# Altium footprint library Hydra_Ref_pcb.PcbLib: 353 footprints (part 21 of 23)
Each footprint in its own frame and in the unit in brackets; x right, y up, seen from the top. Pads: shape width x height; smd on the part's side, far side on the other; paste and mask are expansions set on the pad; w line width, h text height; cw(c..) or ccw(c..) is an arc to the next point about the centre after c.
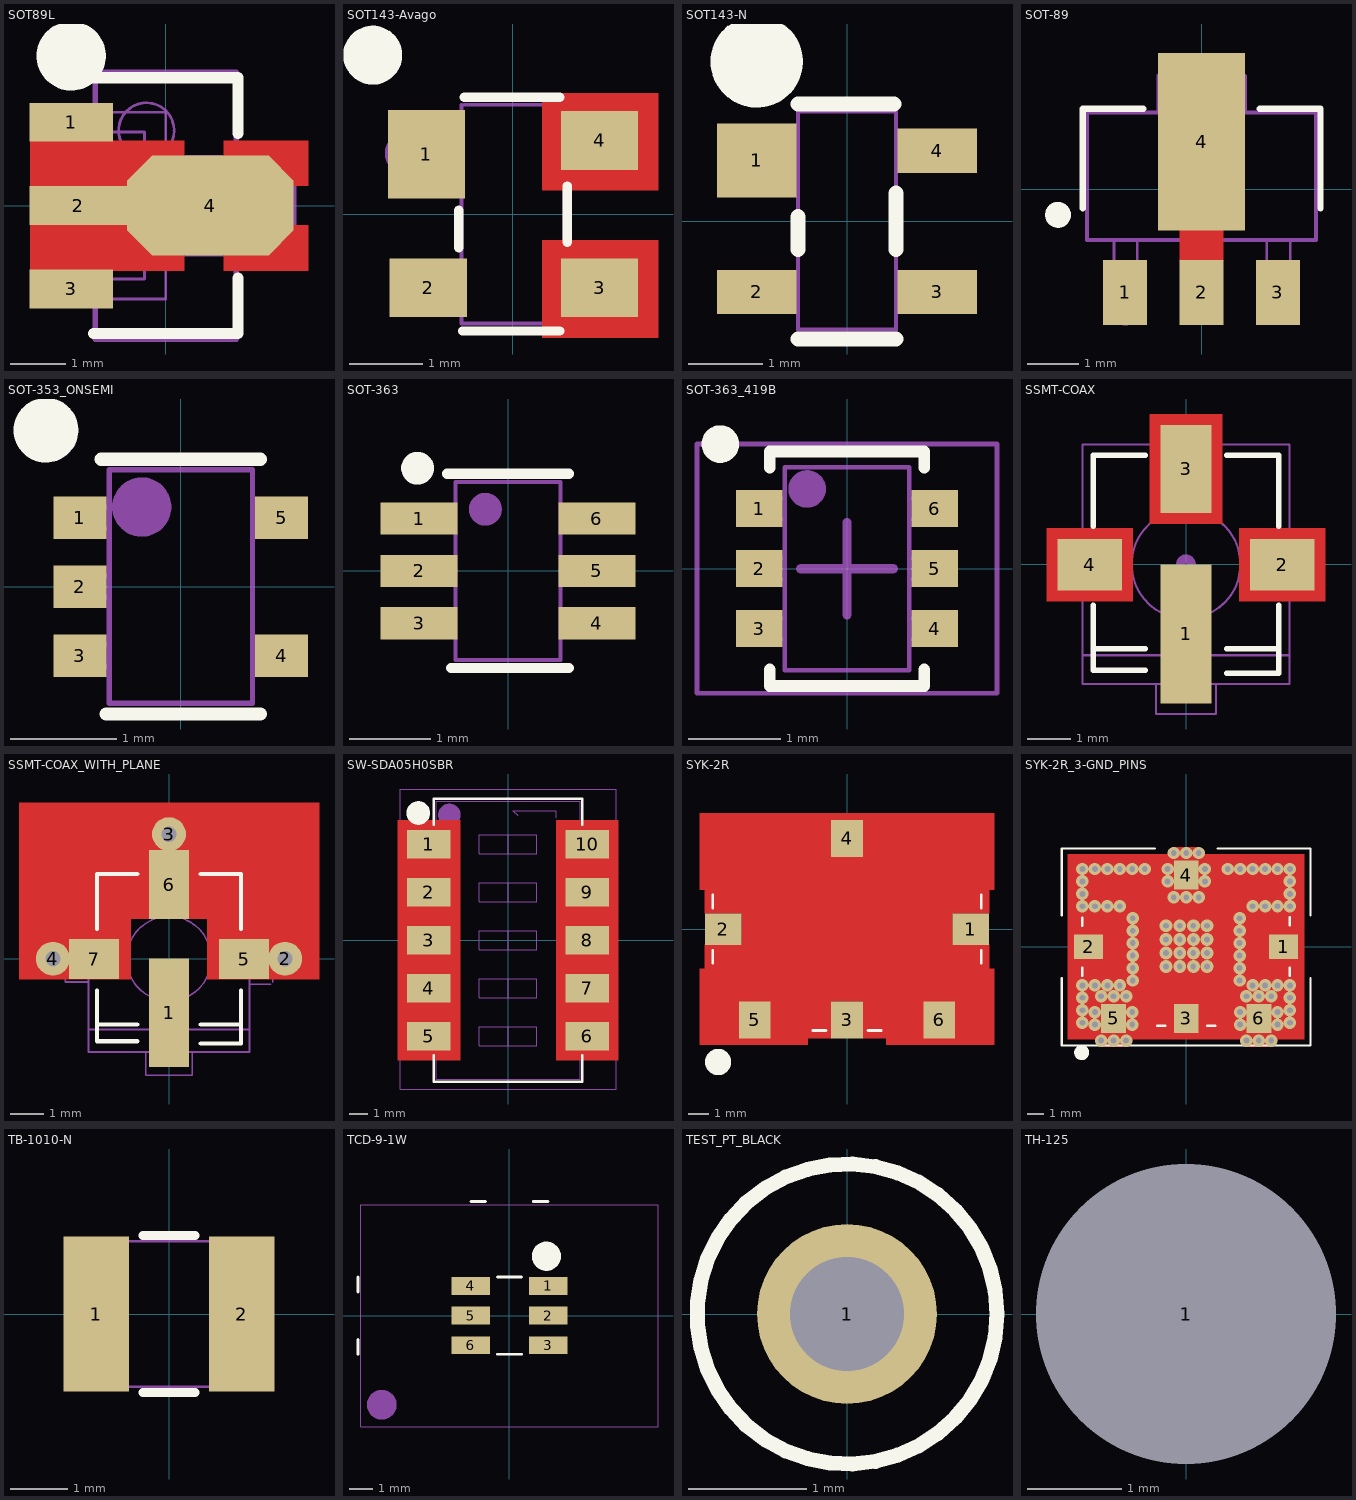
[diagram p20: the footprints below, top view; thin cyan lines are the x and y axes]

## SOT89L [mil] "SOT89, 3-Leads, Body 4.5x2.4 mm, Pitch 1.5mm, Lead Span 4.1mm, IPC High Density"
height 63
pads (4):
  rect 59x27.5 smd: 1(-66.93,59.06) 3(-66.93,-59.06)
  rect 69x27.5 smd: 2(-62,0)
  oct 118.11x70.87 smd: 4(31.5,0)
Top Layer:
  pour cut-out: 13,-46 -96,-46 -96,-14 -90,-14 -90,14 -96,14 -96,46 13,46
  pour cut-out: 76,-46 41,-46 41,46 76,46
  pour cut-out: 101,46 101,14 76,14 76,46
  pour cut-out: 101,-46 101,-14 76,-14 76,-46
Top Overlay:
  circle w25: c-67,106 r12
  lines w7.87: -51.18,-90.55 51.18,-90.55 51.18,-51.18 ; -51.18,90.55 51.18,90.55 51.18,51.18
9 Top Assy:
  lines w3: -50,-66.06 -70,-66.06 -70,-52.06 -50,-52.06 ; -50,-7 -70,-7 -70,7 -50,7 ; -50,52.06 -70,52.06 -70,66.06 -50,66.06
  lines w3.94: -50,-94.49 -50,94.49 50,94.49 50,-94.49 -50,-94.49
  lines w5: 50,-35 75,-35 90,-20 90,20 75,35 50,35
  text ".Designator" at -37.37,-11.55 h29
13 Top 3D Bodies:
  circle w2: c-13.78,53.15 r19.68
  lines w2: -49.21,-90.55 -49.21,88.58 49.21,88.58 49.21,-90.55 -49.21,-90.55
Mechanical 30:
  lines w2: -70,-66.06 0,-66.06 0,-35 75,-35 90,-20 90,20 75,35 0,35 0,66.06 -70,66.06 -70,52.06 -15,52.06 -15,7 -70,7 -70,-7 -15,-7 -15,-52.06 -70,-52.06 -70,-66.06
3D body: height 14.96, standoff 0, extent -70.02,-66.08 90.02,66.08
3D body: height 63, standoff 0, extent -49.19,-90.53 49.19,88.56

## SOT143-Avago [mm] "1.9mm PITCH 1.3mmW 2.3mmL 1.1mmH -4pins"
height 1.2
pads (4):
  rect 1.05x1.2 smd: 1(-1.175,0.813)
  rect 1.05x0.8 smd: 2(-1.15,-1) 3(1.175,-1) 4(1.175,1)
Top Layer:
  pour cut-out: 0.395,1.644 1.969,1.644 1.969,0.324 0.395,0.324
  pour cut-out: 0.395,-0.356 1.969,-0.356 1.969,-1.676 0.395,-1.676
Top Overlay:
  circle w0.4: c-1.905,2.159 r0.2
  lines w0.127: -0.737,-0.457 -0.737,0.051 ; -0.686,-1.587 0.635,-1.587 ; -0.66,1.588 0.635,1.588 ; 0.737,-0.381 0.737,0.381
9 Top Assy:
  circle w0.305: c-1.46,0.826 r0.127
  lines w0.051: -0.7,-1.27 -1.325,-1.27 -1.325,-0.73 -0.7,-0.73 ; -0.7,0.381 -1.365,0.381 -1.365,1.281 -0.7,1.281 ; -0.7,1.486 -0.7,-1.486 0.7,-1.486 0.7,1.486 ; -0.66,1.486 0.66,1.486 ; 0.7,-1.27 1.325,-1.27 1.325,-0.73 0.7,-0.73 ; 0.7,0.73 1.325,0.73 1.325,1.27 0.7,1.27
  text ".Designator" at -0.24,1.156 h0.71
3D body: height 1.2, standoff 0, extent -1.9,-1.75 1.9,1.75

## SOT143-N [mm] "1.9mm PITCH 1.3mmW 2.3mmL 1.1mmH -4pins"
height 1.194
pads (4):
  rect 1.07x1 smd: 1(-1.22,0.825)
  rect 1.07x0.6 smd: 2(-1.22,-0.953) 3(1.22,-0.953) 4(1.22,0.952)
Top Overlay:
  circle w0.635: c-1.219,2.159 r0.305
  lines w0.203: -0.66,-1.587 0.66,-1.587 ; -0.66,-0.381 -0.66,0.064 ; -0.66,1.587 0.635,1.587 ; 0.66,-0.381 0.66,0.381
9 Top Assy:
  circle w0.305: c-1.46,0.826 r0.127
  lines w0.051: -0.66,-1.118 -1.143,-1.118 -1.143,-0.813 -0.66,-0.813 ; -0.66,0.381 -1.143,0.381 -1.143,1.27 -0.66,1.27 ; 0.66,-1.092 1.143,-1.092 1.143,-0.788 0.66,-0.788 ; 0.66,0.813 1.143,0.813 1.143,1.117 0.66,1.117 ; -0.66,-1.461 0.66,-1.461 0.66,1.486 -0.66,1.486 -0.66,-1.461
  text ".Designator" at 0.35,-1.25 h0.71
3D body: height 1.19, standoff 0, extent -1.95,-1.75 1.95,1.905

## SOT-89 [mil] "Pins 2 and 4 connected to GND"
height 63
pads (5):
  rect 34x50 smd: 1(-59.06,-80) 2(0,-80) 3(59.06,-80)
  round 0 smd paste-1000 mask-1000: 2(0,77.5)
  rect 66.93x137.01 smd: 4(0,36.5)
Top Layer:
  rectangle: -17,-55.51 17,-31.5
Top Overlay:
  circle w10: c-111,-20 r5
  lines w5: -92,-15 -92,62 -45,62 ; 45,62 92,62 92,-15
Top Paste:
  region: -33.7,-32 -17,-32 -17,-104.8 16.9,-104.8 16.9,-32.1 33.3,-32.1 33.3,104.9 -33.7,104.9
Top Solder:
  pour cut-out: -87,-116 -87,-50 -45,116 45,116 87,-50 87,-116
  region: -37,-36 -21,-36 -21,-109 21,-109 21,-36 37,-36 37,109 -37,109
Bottom Solder:
  rectangle: -51,-116 50,112
9 Top Assy:
  circle w12: c-59.3,-94.5 r5
  lines w2: -34,59.06 -34,87.8 34,87.8 34,59.06
  lines w2.01: -67.72,-39.37 -67.72,-78.74 -49.61,-78.74 -49.61,-39.37 ; -9.45,-39.37 -9.45,-78.74 8.66,-78.74 8.66,-39.37 ; 50.39,-39.37 50.39,-78.74 68.5,-78.74 68.5,-39.37
  lines w3: -88.58,-39.37 -88.58,59.06 88.58,59.06 88.58,-39.37 -88.58,-39.37
  text ".Designator" at -49,4 h20
3D body: height 63, standoff 0, extent -88.56,-39.35 88.56,59.04

## SOT-353_ONSEMI [mm] "CASE 419A-02, ISSUE J"
height 1.1
pads (5):
  rect 0.5x0.4 smd: 1(-0.95,0.65) 2(-0.95,0) 3(-0.95,-0.65) 4(0.95,-0.65) 5(0.95,0.65)
Top Overlay:
  circle w0.305: c-1.27,1.473 r0.152
  lines w0.127: -0.75,1.2 0.75,1.2 ; -0.702,-1.2 0.75,-1.2
9 Top Assy:
  circle w0.305: c-0.368,0.749 r0.127
  lines w0.051: -0.828,-0.749 -0.828,-0.545 ; -0.828,-0.101 -0.828,0.102 ; -0.828,0.547 -0.828,0.75 ; -0.675,-0.749 -1.05,-0.749 -1.05,-0.545 -0.675,-0.545 ; -0.675,-0.101 -1.05,-0.101 -1.05,0.102 -0.675,0.102 ; -0.675,0.547 -1.05,0.547 -1.05,0.75 -0.675,0.75 ; 0.675,-0.749 1.05,-0.749 1.05,-0.545 0.675,-0.545 ; 0.675,0.547 1.05,0.547 1.05,0.75 0.675,0.75 ; 0.828,-0.749 0.828,-0.545 ; 0.828,0.547 0.828,0.75 ; -0.675,-1.1 0.675,-1.1 0.675,1.1 -0.675,1.1 -0.675,-1.1
  text ".Designator" at 0.55,-0.95 h0.56
3D body: height 1.1, standoff 0, extent -0.675,-1.1 0.675,1.1

## SOT-363 [mm] "JEDEC MO-203AB"
height 1.092
pads (6):
  rect 0.95x0.4 smd: 1(-1.1,0.648) 2(-1.1,0) 3(-1.1,-0.648) 4(1.1,-0.648) 5(1.1,0) 6(1.1,0.648)
Top Overlay:
  circle w0.203: c-1.118,1.27 r0.102
  lines w0.127: -0.75,1.2 0.75,1.2 ; -0.702,-1.2 0.75,-1.2
Top Solder:
  pour cut-out: -1.854,1.143 1.854,1.143 1.854,-1.143 -1.854,-1.143
9 Top Assy:
  circle w0.203: c-0.279,0.762 r0.102
  lines w0.051: -0.828,-0.749 -0.828,-0.545 ; -0.828,-0.101 -0.828,0.102 ; -0.828,0.547 -0.828,0.75 ; -0.65,-0.749 -1.05,-0.749 -1.05,-0.545 -0.65,-0.545 ; -0.65,-0.101 -1.05,-0.101 -1.05,0.102 -0.65,0.102 ; -0.65,0.547 -1.05,0.547 -1.05,0.75 -0.65,0.75 ; 0.65,-0.749 1.05,-0.749 1.05,-0.545 0.65,-0.545 ; 0.65,-0.102 1.05,-0.102 1.05,0.102 0.65,0.102 ; 0.65,0.547 1.05,0.547 1.05,0.75 0.65,0.75 ; 0.828,-0.749 0.828,-0.545 ; 0.828,-0.102 0.828,0.102 ; 0.828,0.547 0.828,0.75 ; -0.65,-1.1 -0.65,1.1 0.65,1.1 0.65,-1.1 -0.65,-1.1
  text ".Designator" at 0.406,-0.889 h0.46
3D body: height 1.1, standoff 0, extent -0.65,-1.1 0.65,1.1

## SOT-363_419B [mm] "SC-88/SC70-6/SOT-363, CASE 419B-02, 6-Leads, Body 2.00x2.10mm, Pitch 0.65mm"
height 1.1
pads (6):
  rect 0.5x0.4 smd: 1(-0.95,0.65) 2(-0.95,0) 3(-0.95,-0.65) 4(0.95,-0.65) 5(0.95,0) 6(0.95,0.65)
Top Overlay:
  circle w0.203: c-1.372,1.35 r0.102
  lines w0.127: -0.838,-1.092 -0.838,-1.27 0.838,-1.27 0.838,-1.092 ; -0.838,1.092 -0.838,1.27 0.838,1.27 0.838,1.092
9 Top Assy:
  circle w0.203: c-0.432,0.864 r0.102
  lines w0.038: -0.838,-0.767 -0.838,-0.538 ; -0.838,-0.117 -0.838,0.112 ; -0.838,0.533 -0.838,0.762 ; -0.675,-0.767 -0.965,-0.767 -0.965,-0.538 -0.675,-0.538 ; -0.675,-0.117 -0.965,-0.117 -0.965,0.112 -0.675,0.112 ; -0.675,0.533 -0.965,0.533 -0.965,0.762 -0.675,0.762 ; 0.675,-0.767 0.965,-0.767 0.965,-0.538 0.675,-0.538 ; 0.675,-0.117 0.965,-0.117 0.965,0.112 0.675,0.112 ; 0.675,0.533 0.965,0.533 0.965,0.762 0.675,0.762 ; 0.838,-0.767 0.838,-0.538 ; 0.838,-0.117 0.838,0.112 ; 0.838,0.533 0.838,0.762
  lines w0.051: -0.675,-1.1 0.675,-1.1 ; 0.675,-1.1 0.675,1.1 -0.675,1.1 -0.675,-1.1 0.675,-1.1
  text ".Designator" at 0.254,-0.762 h0.51
15 Top Optical Placement:
  lines w0.051: -1.625,-1.35 -1.625,1.35 1.625,1.35 1.625,-1.35 -1.625,-1.35
  lines w0.1: -0.5,0 0.5,0 ; 0,-0.5 0,0.5
3D body: height 1.1, standoff 0, extent -0.675,-1.1 0.675,1.1

## SSMT-COAX [mil] "OLD PART"
pads (4):
  rect 47x128 smd paste-1000 mask-1000: 1(0,-64)
  rect 59x47 smd paste-1000 mask-1000: 2(88.5,-0.5) 4(-88.5,-0.5)
  rect 47x81 smd paste-1000 mask-1000: 3(0,87.5)
Top Layer:
  pour cut-out: 33.5,138 -33.5,138 -33.5,37 33.5,37
  pour cut-out: 128,-34 128,33 49,33 49,-34
  pour cut-out: -49,-34 -49,33 -128,33 -128,-34
Top Overlay:
  lines w5: -85,-77.5 -37.5,-77.5 ; -85,-37.5 -85,-97.5 -37.5,-97.5 ; -85,35 -85,100 -37.5,100 ; 37.5,-100 85,-100 85,-37.5 ; 37.5,-77.5 85,-77.5 ; 37.5,100 85,100 85,35
Top Paste:
  region: -118,23 -118,-24 -59,-24 -59,23
  region: -23.5,128 -23.5,47 23.5,47 23.5,128
  region: -23.5,-128 23.5,-128 23.5,0 -23.5,0
  region: 59,23 59,-24 118,-24 118,23
Top Solder:
  region: -118,23 -118,-24 -59,-24 -59,23
  region: -23.5,128 -23.5,47 23.5,47 23.5,128
  region: -23.5,-128 23.5,-128 23.5,0 -23.5,0
  region: 59,23 59,-24 118,-24 118,23
9 Top Assy:
  circle w2: c0,0 r50
  circle w8: c0,0 r5
  lines w2: -95,-83.5 95,-83.5 ; -95,-27.5 -122.5,-27.5 -122.5,27.5 -95,27.5 ; -27.5,-110 -27.5,-137.5 27.5,-137.5 27.5,-110 ; -27.5,110 -27.5,132.5 27.5,132.5 27.5,110 ; 95,-30 120,-30 122.5,-27.5 122.5,27.5 95,27.5 ; -95,-110 95,-110 95,110 -95,110 -95,-110
  text ".Designator" at -70,60 h40

## SSMT-COAX_WITH_PLANE [mil] "OLD PART WITH PLAINE"
pads (7):
  rect 47x128 smd paste-1000 mask-1000: 1(0,-64)
  round 40 / inner round 60 / far side round 60 hole 18: 2(137,0) 3(0,147) 4(-137,0)
  rect 59x47 smd paste-1000 mask-1000: 5(88.5,-0.5) 7(-88.5,-0.5)
  rect 47x81 smd paste-1000 mask-1000: 6(0,87.5)
Top Layer:
  region: 45,47 45,-24 177,-24 177,184 -177,184 -177,-24 -45,-24 -45,47
Top Overlay:
  lines w5: -85,-77.5 -37.5,-77.5 ; -85,-37.5 -85,-97.5 -37.5,-97.5 ; -85,35 -85,100 -37.5,100 ; 37.5,-100 85,-100 85,-37.5 ; 37.5,-77.5 85,-77.5 ; 37.5,100 85,100 85,35
Top Paste:
  region: 59,23 59,-24 118,-24 118,23
  region: -23.5,-128 23.5,-128 23.5,0 -23.5,0
  region: -23.5,128 -23.5,47 23.5,47 23.5,128
  region: -118,23 -118,-24 -59,-24 -59,23
Top Solder:
  region: 59,23 59,-24 118,-24 118,23
  region: -23.5,-128 23.5,-128 23.5,0 -23.5,0
  region: -23.5,128 -23.5,47 23.5,47 23.5,128
  region: -118,23 -118,-24 -59,-24 -59,23
7 DXF/DWG Import:
  text ".Designator" at -85,60 h45
9 Top Assy:
  circle w2: c0,0 r50
  lines w2: -95,-83.5 95,-83.5 ; -95,-27.5 -122.5,-27.5 -122.5,27.5 -95,27.5 ; -27.5,-110 -27.5,-137.5 27.5,-137.5 27.5,-110 ; -27.5,110 -27.5,132.5 27.5,132.5 27.5,110 ; 95,-30 120,-30 ; 95,27.5 122.5,27.5 122.5,-27.5 ; -95,-110 95,-110 95,110 -95,110 -95,-110

## SW-SDA05H0SBR [mil] "Low profile DIP Swithch"
height 175
pads (10):
  rect 90x60 smd: 1(-165,200) 2(-165,100) 3(-165,0) 4(-165,-100) 5(-165,-200) 6(165,-200) 7(165,-100) 8(165,0) 9(165,100) 10(165,200)
Top Layer:
  pour cut-out: 100,-250 100,250 230,250 230,-250
  pour cut-out: -230,-250 -230,250 -100,250 -100,-250
Top Overlay:
  circle w25: c-187,265 r12
  lines w5: -155,-240 -155,-295 155,-295 155,-240 ; -155,240 -155,295 155,295 155,240
9 Top Assy:
  circle w25: c-122,261 r11
  lines w2: 0,-220 0,-180 ; 0,-120 0,-80 ; 0,-20 0,20 ; 0,80 0,120 ; 0,180 0,220 ; 20,260 10,270 100,270 100,255 ; -150,-290 -150,290 150,290 150,-290 -150,-290 ; -60,-220 60,-220 60,-180 -60,-180 -60,-220 ; -60,-120 -60,-80 60,-80 60,-120 -60,-120 ; -60,-20 -60,20 60,20 60,-20 -60,-20 ; -60,80 -60,120 60,120 60,80 -60,80 ; -60,180 -60,220 60,220 60,180 -60,180
  text ".Designator" at -85,-280 h50
13 Top 3D Bodies:
  lines w2: -225,-310 -225,315 225,315 225,-310 -225,-310
3D body: height 175, standoff 0, extent -225,-310 225,315

## SYK-2R [mil] "CASE STYLE TTT167"
height 230
pads (6):
  rect 70x60 smd: 1(235,0) 2(-235,0)
  rect 60x70 smd: 3(0,-172.5) 4(0,172.5) 5(-175,-172.5) 6(175,-172.5)
Top Layer:
  pour cut-out: 30,-207.5 30,-137.5 -30,-137.5 -30,-207.5 -75,-207.5 -75,-87.5 75,-87.5 75,-207.5
  pour cut-out: 270,30 200,30 200,-30 270,-30 270,-75 150,-75 150,75 270,75
  pour cut-out: -270,-30 -200,-30 -200,30 -270,30 -270,75 -150,75 -150,-75 -270,-75
  region: 280,75 150,75 150,-75 280,-75 280,-220 75,-220 75,-87.5 -75,-87.5 -75,-220 -280,-220 -280,-75 -150,-75 -150,75 -280,75 -280,220 280,220
Top Overlay:
  circle w30: c-245,-252.5 r10
  lines w5: -255,-65 -255,-40 ; -255,40 -255,65 ; -65,-192.5 -40,-192.5 ; 40,-192.5 65,-192.5 ; 255,-65 255,-40 ; 255,40 255,65
Top Paste:
  region: 280,75 150,75 150,-75 280,-75 280,-220 75,-220 75,-87.5 -75,-87.5 -75,-220 -280,-220 -280,-75 -150,-75 -150,75 -280,75 -280,220 280,220
Top Solder:
  region: 285,70 155,70 155,-70 285,-70 285,-225 70,-225 70,-92.5 -70,-92.5 -70,-225 -285,-225 -285,-70 -155,-70 -155,70 -285,70 -285,225 285,225
9 Top Assy:
  circle w30: c-215,-150 r10
  lines w2: -250,-187 -250,187 250,187 250,-187 -250,-187
  text ".Designator" at -175,-30 h22
3D body: height 230, standoff 0, extent -305,-245 305,245

## SYK-2R_3-GND_PINS [mil] "CASE STYLE TTT167"
height 230
pads (6):
  rect 70x60 smd: 1(235,0) 2(-235,0)
  rect 60x70 smd: 3(0,-172.5) 4(0,172.5) 5(-175,-172.5) 6(175,-172.5)
via 30,226 diameter 30 hole 14
via 0,226 diameter 30 hole 14
via -30,226 diameter 30 hole 14
via 145,-226 diameter 30 hole 14
via 175,-226 diameter 30 hole 14
via 205,-226 diameter 30 hole 14
via -145,-226 diameter 30 hole 14
via -175,-226 diameter 30 hole 14
via -205,-226 diameter 30 hole 14
via 250,-183.02 diameter 30 hole 14
via 250,-153.02 diameter 30 hole 14
via 250,-123.02 diameter 30 hole 14
via -250,-183.02 diameter 30 hole 14
via -250,-153.02 diameter 30 hole 14
via -250,-123.02 diameter 30 hole 14
via -145,-119 diameter 30 hole 14
via -175,-119 diameter 30 hole 14
via -205,-119 diameter 30 hole 14
via -130,-157.5 diameter 30 hole 14
via -130,-187.5 diameter 30 hole 14
via -220,-157.5 diameter 30 hole 14
via -220,-187.5 diameter 30 hole 14
via 45,187.5 diameter 30 hole 14
via 45,157.5 diameter 30 hole 14
via -45,187.5 diameter 30 hole 14
via -45,157.5 diameter 30 hole 14
via 30,119 diameter 30 hole 14
via 0,119 diameter 30 hole 14
via -30,119 diameter 30 hole 14
via 130,-187.5 diameter 30 hole 14
via 130,-157.5 diameter 30 hole 14
via 220,-187.5 diameter 30 hole 14
via 220,-157.5 diameter 30 hole 14
via 145,-119 diameter 30 hole 14
via 175,-119 diameter 30 hole 14
via 205,-119 diameter 30 hole 14
via -220,187.5 diameter 30 hole 14
via -250,187.5 diameter 30 hole 14
via -190,187.5 diameter 30 hole 14
via -160,187.5 diameter 30 hole 14
via -130,187.5 diameter 30 hole 14
via -100,187.5 diameter 30 hole 14
via -250,157.5 diameter 30 hole 14
via -250,127.5 diameter 30 hole 14
via -250,97.5 diameter 30 hole 14
via -220,97.5 diameter 30 hole 14
via -190,97.5 diameter 30 hole 14
via -160,97.5 diameter 30 hole 14
via -128.79,68.79 diameter 30 hole 14
via -128.79,38.79 diameter 30 hole 14
via -128.79,8.79 diameter 30 hole 14
via -128.79,-21.21 diameter 30 hole 14
via -128.79,-51.21 diameter 30 hole 14
via -128.79,-81.21 diameter 30 hole 14
via -190,-93.02 diameter 30 hole 14
via -160,-93.02 diameter 30 hole 14
via -220,-93.02 diameter 30 hole 14
via -250,-93.02 diameter 30 hole 14
via 160,97.5 diameter 30 hole 14
via 190,97.5 diameter 30 hole 14
via 220,97.5 diameter 30 hole 14
via 250,97.5 diameter 30 hole 14
via 250,127.5 diameter 30 hole 14
via 250,157.5 diameter 30 hole 14
via 100,187.5 diameter 30 hole 14
via 130,187.5 diameter 30 hole 14
via 160,187.5 diameter 30 hole 14
via 190,187.5 diameter 30 hole 14
via 250,187.5 diameter 30 hole 14
via 220,187.5 diameter 30 hole 14
via 250,-93.02 diameter 30 hole 14
via 220,-93.02 diameter 30 hole 14
via 160,-93.02 diameter 30 hole 14
via 190,-93.02 diameter 30 hole 14
via 128.79,-81.21 diameter 30 hole 14
via 128.79,-51.21 diameter 30 hole 14
via 128.79,-21.21 diameter 30 hole 14
via 128.79,8.79 diameter 30 hole 14
via 128.79,38.79 diameter 30 hole 14
via 128.79,68.79 diameter 30 hole 14
via -15.6,-47.8 diameter 31 hole 14
via 17.2,-47.8 diameter 31 hole 14
via 50,-47.8 diameter 31 hole 14
via -15.6,-15 diameter 31 hole 14
via 17.2,-15 diameter 31 hole 14
via 50,-15 diameter 31 hole 14
via -15.6,17.8 diameter 31 hole 14
via 17.2,17.8 diameter 31 hole 14
via 50,17.8 diameter 31 hole 14
via -48.4,17.8 diameter 31 hole 14
via -48.4,-15 diameter 31 hole 14
via -48.4,-47.8 diameter 31 hole 14
via 50,50.6 diameter 31 hole 14
via 17.2,50.6 diameter 31 hole 14
via -15.6,50.6 diameter 31 hole 14
via -48.4,50.6 diameter 31 hole 14
Top Layer:
  region: 45,226 -45,226 -45,190 45,190
  region: 30,241 -30,241 -30,226 30,226
  rectangle: 130,-226 220,-190
  rectangle: 145,-241 205,-226
  rectangle: -205,-241 -145,-226
  rectangle: -220,-226 -130,-190
  region: 270,75 150,75 150,-75 275,-75 275,-213 75,-213 75,-87.5 -75,-87.5 -75,-213 -275,-213 -275,-75 -150,-75 -150,75 -270,75 -270,213 270,213
  pour cut-out: -285,223 285,223 285,-223 -285,-223
Top Overlay:
  circle w18: c-252,-255 r9
  lines w5: -300,-75 -300,-237.5 300,-237.5 300,-75 ; -300,75 -300,237 -75,237 ; 75,237 300,237 300,75
  lines w6: -250,-70 -250,-51 ; -250,51 -250,70 ; -70,-190 -51,-190 ; 51,-190 70,-190 ; 250,-70 250,-51 ; 250,52 250,71
Top Solder:
  region: 295,120 295,232 45,232 45,120
  region: -44,120 -44,232 -295,232 -295,120
  rectangle: -88,222 89,232
  region: -285,-69 -285,75 -295,75 -295,-69
  region: 291,-222.5 -295,-222.5 -295,-232.5 291,-232.5
  region: -219,-232.5 -219,-120 -295,-120 -295,-232.5
  region: -44,-230 -44,-120 -131,-120 -131,-230
  region: 131,-230 131,-121 44,-121 44,-230
  region: 294,-232.5 294,-119 219,-119 219,-232.5
  region: 284,69 284,-75 294,-75 294,69
  region: 294,44 274,44 274,-44 294,-44 294,-122.5 -295,-122.5 -295,-44 -275,-44 -275,44 -295,44 -295,124 294,124
9 Top Assy:
  circle w30: c-215,-150 r10
  lines w2: -250,-190 -250,190 250,190 250,-190 -250,-190
  text ".Designator" at -100,-30 h60
3D body: height 230, standoff 0, extent -305,-245 305,245

## TB-1010-N [mm] "METRIC 3225"
height 1.016
pads (2):
  rect 1.15x2.7 smd: 1(-1.27,0) 2(1.27,0)
Top Overlay:
  lines w0.152: -0.457,-1.372 0.457,-1.372 ; -0.457,1.372 0.457,1.372
9 Top Assy:
  lines w0.051: -1.27,-1.27 1.27,-1.27 1.27,1.27 -1.27,1.27 -1.27,-1.27
  text ".Designator" at -0.889,-0.254 h0.51
3D body: height 1.02, standoff 0.01, extent -1.27,-1.27 1.27,1.27

## TCD-9-1W [mil] "OLD PART"
pads (6):
  rect 65x30 smd: 1(65,50) 2(65,0) 3(65,-50) 4(-65,50) 5(-65,0) 6(-65,-50)
Top Overlay:
  circle w25: c62,100 r12
  lines w5: -20,-65 20,-65 ; -20,65 20,65 ; -255,-65 -255,-40 ; -255,-65 -255,-40 ; -255,-65 -255,-40 ; -255,40 -255,65 ; -255,40 -255,65 ; -255,40 -255,65 ; -65,192.5 -40,192.5 ; -65,192.5 -40,192.5 ; -65,192.5 -40,192.5 ; 40,192.5 65,192.5 ; 40,192.5 65,192.5 ; 40,192.5 65,192.5
9 Top Assy:
  circle w30: c-215,-150 r10
  circle w30: c-215,-150 r10
  circle w30: c-215,-150 r10
  lines w2: -250,-187 250,-187 ; -250,-187 -250,187 ; -250,-187 250,-187 ; -250,-187 -250,187 ; -250,-187 250,-187 ; -250,-187 -250,187 ; -250,187 250,187 ; -250,187 250,187 ; -250,187 250,187 ; 250,-187 250,187 ; 250,-187 250,187 ; 250,-187 250,187

## TEST_PT_BLACK [mil]
pads (1):
  round 60 hole 38: 1(0,0)
Top Overlay:
  circle w5: c0,0 r50
9 Top Assy:
  circle w2: c0,0 r50
  text ".Designator" at 60,-10 h28

## TH-125 [mil] "Tooling Hole 125"
pads (1):
  round 50 hole 125 mask+45: 1(0,0)